# Altium footprint library Integrated_Circuit.PcbLib: 85 footprints (part 6 of 6)
Each footprint in its own frame and in the unit in brackets; x right, y up, seen from the top. Pads: shape width x height; smd on the part's side, far side on the other; paste and mask are expansions set on the pad; w line width, h text height; cw(c..) or ccw(c..) is an arc to the next point about the centre after c.
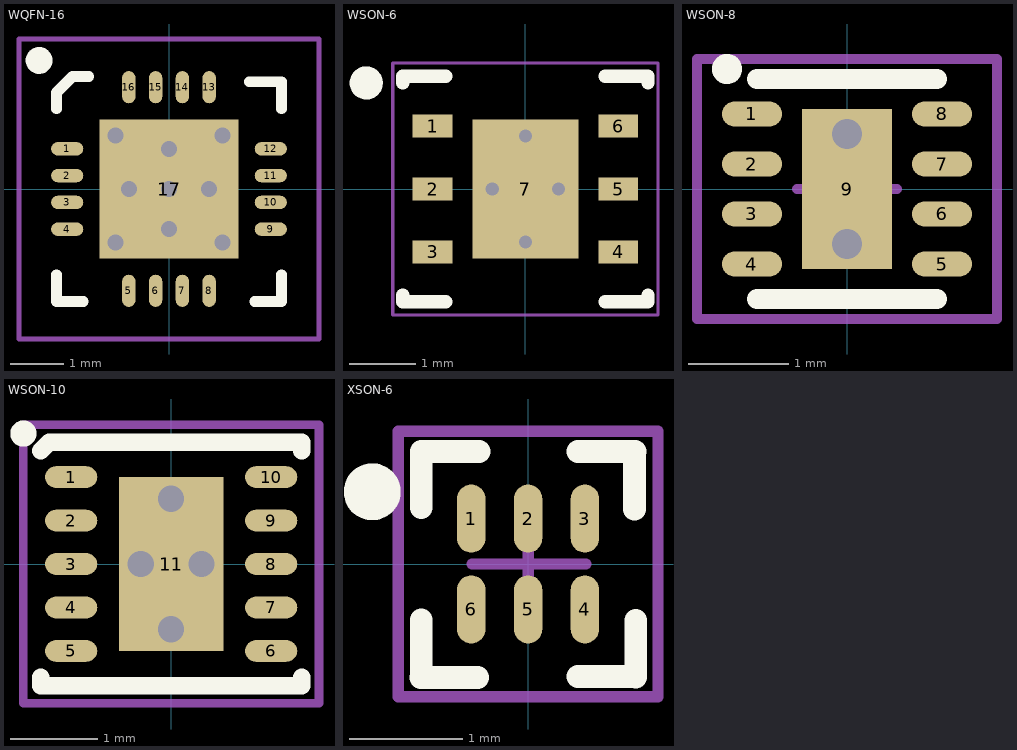
[diagram p5: the footprints below, top view; thin cyan lines are the x and y axes]

## WQFN-16 [mm] "QFN, 16 Pin, 0.5mm Pitch"
height 0.8
pads (17):
  oval 0.6x0.25 smd: 1(-1.9,0.75) 2(-1.9,0.25) 3(-1.9,-0.25) 4(-1.9,-0.75) 9(1.9,-0.75) 10(1.9,-0.25) 11(1.9,0.25) 12(1.9,0.75)
  oval 0.25x0.6 smd: 5(-0.75,-1.9) 6(-0.25,-1.9) 7(0.25,-1.9) 8(0.75,-1.9) 13(0.75,1.9) 14(0.25,1.9) 15(-0.25,1.9) 16(-0.75,1.9)
  rect 2.6x2.6 smd: 17(0,0)
via 0,0 diameter 0.5 hole 0.3
via -1,-1 diameter 0.5 hole 0.3
via 1,-1 diameter 0.5 hole 0.3
via 1,1 diameter 0.5 hole 0.3
via -1,1 diameter 0.5 hole 0.3
via 0,-0.75 diameter 0.5 hole 0.3
via 0.75,0 diameter 0.5 hole 0.3
via 0,0.75 diameter 0.5 hole 0.3
via -0.75,0 diameter 0.5 hole 0.3
Top Overlay:
  circle w0.25: c-2.425,2.4 r0.125
  lines w0.2: -2.1,-1.6 -2.1,-2.1 -1.6,-2.1 ; -2.1,1.5 -2.1,1.8 ; -1.5,2.1 -1.8,2.1 -2.1,1.8 ; 1.5,2 2.1,2 2.1,1.5 ; 1.6,-2.1 2.1,-2.1 2.1,-1.6 ; -2.1,1.8 -2.1,1.8
Mechanical 15:
  lines w0.1: -0.5,0 0.5,0 ; 0,-0.5 0,0.5 ; -2.8,-2.8 -2.8,2.8 2.8,2.8 2.8,-2.8 -2.8,-2.8
3D body "WQFN-16 4x4mm 0.5mmPitch.STEP": height 0.81, standoff 0, extent -2.01,-2.01 2.01,2.01

## WSON-6 [mm] "SON, 6-Leads, Body 3x3 mm, Pitch 0.95mm, NSC Recommended"
height 0.8
pads (7):
  rect 0.6x0.35 smd paste-0.175 mask+0.051: 1(-1.4,0.95) 2(-1.4,0) 3(-1.4,-0.95) 4(1.4,-0.95) 5(1.4,0) 6(1.4,0.95)
  rect 1.6x2.1 smd paste-0.8 mask+0.051: 7(0,0)
via -0.5,0 diameter 0.5 hole 0.2
via 0,0.8 diameter 0.5 hole 0.2
via 0.5,0 diameter 0.5 hole 0.2
via 0,-0.8 diameter 0.5 hole 0.2
Top Overlay:
  circle w0.25: c-2.4,1.6 r0.125
  lines w0.2: -1.85,-1.6 -1.85,-1.7 -1.2,-1.7 ; -1.85,1.6 -1.85,1.7 -1.2,1.7 ; 1.2,-1.7 1.85,-1.7 1.85,-1.6 ; 1.2,1.7 1.85,1.7 1.85,1.6
Top Paste:
  rectangle: -1.9,0.775 -1.2,1.125
  rectangle: -1.9,-0.175 -1.2,0.175
  rectangle: -1.9,-1.125 -1.2,-0.775
  region: 1.9,-0.775 1.2,-0.775 1.2,-1.125 1.9,-1.125
  region: 1.9,0.175 1.2,0.175 1.2,-0.175 1.9,-0.175
  region: 1.9,1.125 1.2,1.125 1.2,0.775 1.9,0.775
  region: -0.1,1.05 -0.8,1.05 -0.8,0.1 -0.1,0.1
  rectangle: 0.1,0.1 0.8,1.05
  rectangle: 0.1,-1.05 0.8,-0.1
  region: -0.1,-0.1 -0.8,-0.1 -0.8,-1.05 -0.1,-1.05
Mechanical 15:
  lines w0.05: -2,-1.9 2,-1.9 2,1.9 -2,1.9 -2,-1.9
  lines w0.1: -0.5,0 0.5,0 ; 0,-0.5 0,0.5
3D body "User Library-WSON-6.step": height 0.75, standoff 0, extent -1.51,-1.5 1.51,1.5

## WSON-8 [mm]
height 0.8
pads (9):
  oval 0.6x0.25 smd: 1(-0.95,0.75) 2(-0.95,0.25) 3(-0.95,-0.25) 4(-0.95,-0.75) 5(0.95,-0.75) 6(0.95,-0.25) 7(0.95,0.25) 8(0.95,0.75)
  rect 0.9x1.6 smd: 9(0,0)
via 0,0.55 diameter 0.5 hole 0.3
via 0,-0.55 diameter 0.5 hole 0.3
Top Overlay:
  circle w0.2: c-1.2,1.2 r0.05
  lines w0.2: -0.9,-1.1 0.9,-1.1 ; -0.9,1.1 0.9,1.1
Mechanical 15:
  lines w0.1: -0.5,0 0.5,0 ; 0,-0.5 0,0.5 ; -1.5,-1.3 1.5,-1.3 1.5,1.3 -1.5,1.3 -1.5,-1.3
3D body "User Library-SON8-2x2mm-1.step": height 0.77, standoff -0.03, extent -1,-1 1,1

## WSON-10 [mm]
height 0.8
pads (11):
  oval 0.6x0.25 smd: 1(-1.15,1) 2(-1.15,0.5) 3(-1.15,0) 4(-1.15,-0.5) 5(-1.15,-1) 6(1.15,-1) 7(1.15,-0.5) 8(1.15,0) 9(1.15,0.5) 10(1.15,1)
  rect 1.2x2 smd: 11(0,0)
via 0,0.75 diameter 0.5 hole 0.3
via 0,-0.75 diameter 0.5 hole 0.3
via 0.35,0 diameter 0.5 hole 0.3
via -0.35,0 diameter 0.5 hole 0.3
Top Overlay:
  circle w0.2: c-1.7,1.5 r0.05
  lines w0.2: -1.5,-1.3 -1.5,-1.4 1.5,-1.4 1.5,-1.3 ; 1.5,1.3 1.5,1.4 ; 1.5,1.398 -1.402,1.398 -1.5,1.3 ; -1.5,1.3 -1.5,1.3 ; 1.5,-1.3 1.5,-1.3
Mechanical 15:
  lines w0.1: -0.5,0 0.5,0 ; 0,-0.5 0,0.5 ; -1.7,-1.6 1.7,-1.6 1.7,1.6 -1.7,1.6 -1.7,-1.6
3D body "DSK10_2X1P2.step": height 0.8, standoff 0, extent -1.3,-1.3 1.3,1.3

## XSON-6 [mm]
height 0.5
pads (6):
  oval 0.25x0.6 smd: 1(-0.5,0.4) 2(0,0.4) 3(0.5,0.4) 4(0.5,-0.4) 5(0,-0.4) 6(-0.5,-0.4)
Top Overlay:
  circle w0.25: c-1.372,0.635 r0.125
  lines w0.2: -0.944,-0.999 -0.444,-0.999 ; -0.94,-0.991 -0.94,-0.491 ; -0.94,0.495 -0.94,0.991 -0.432,0.991 ; 0.44,-0.991 0.94,-0.991 ; 0.44,0.991 0.94,0.991 ; 0.936,0.483 0.936,0.983 ; 0.948,-0.995 0.948,-0.495
Mechanical 15:
  lines w0.1: -0.492,0 0.508,0 ; 0,-0.5 0,0.5 ; -1.143,-1.168 1.143,-1.168 1.143,1.168 -1.143,1.168 -1.143,-1.168
3D body "User Library-SOT886 (XSON6).STEP": height 0.5, standoff 0, extent -0.75,-0.55 0.75,0.5